# Altium footprint library OT Library.PcbLib: 396 footprints (part 5 of 25)
Each footprint in its own frame and in the unit in brackets; x right, y up, seen from the top. Pads: shape width x height; smd on the part's side, far side on the other; paste and mask are expansions set on the pad; w line width, h text height; cw(c..) or ccw(c..) is an arc to the next point about the centre after c.
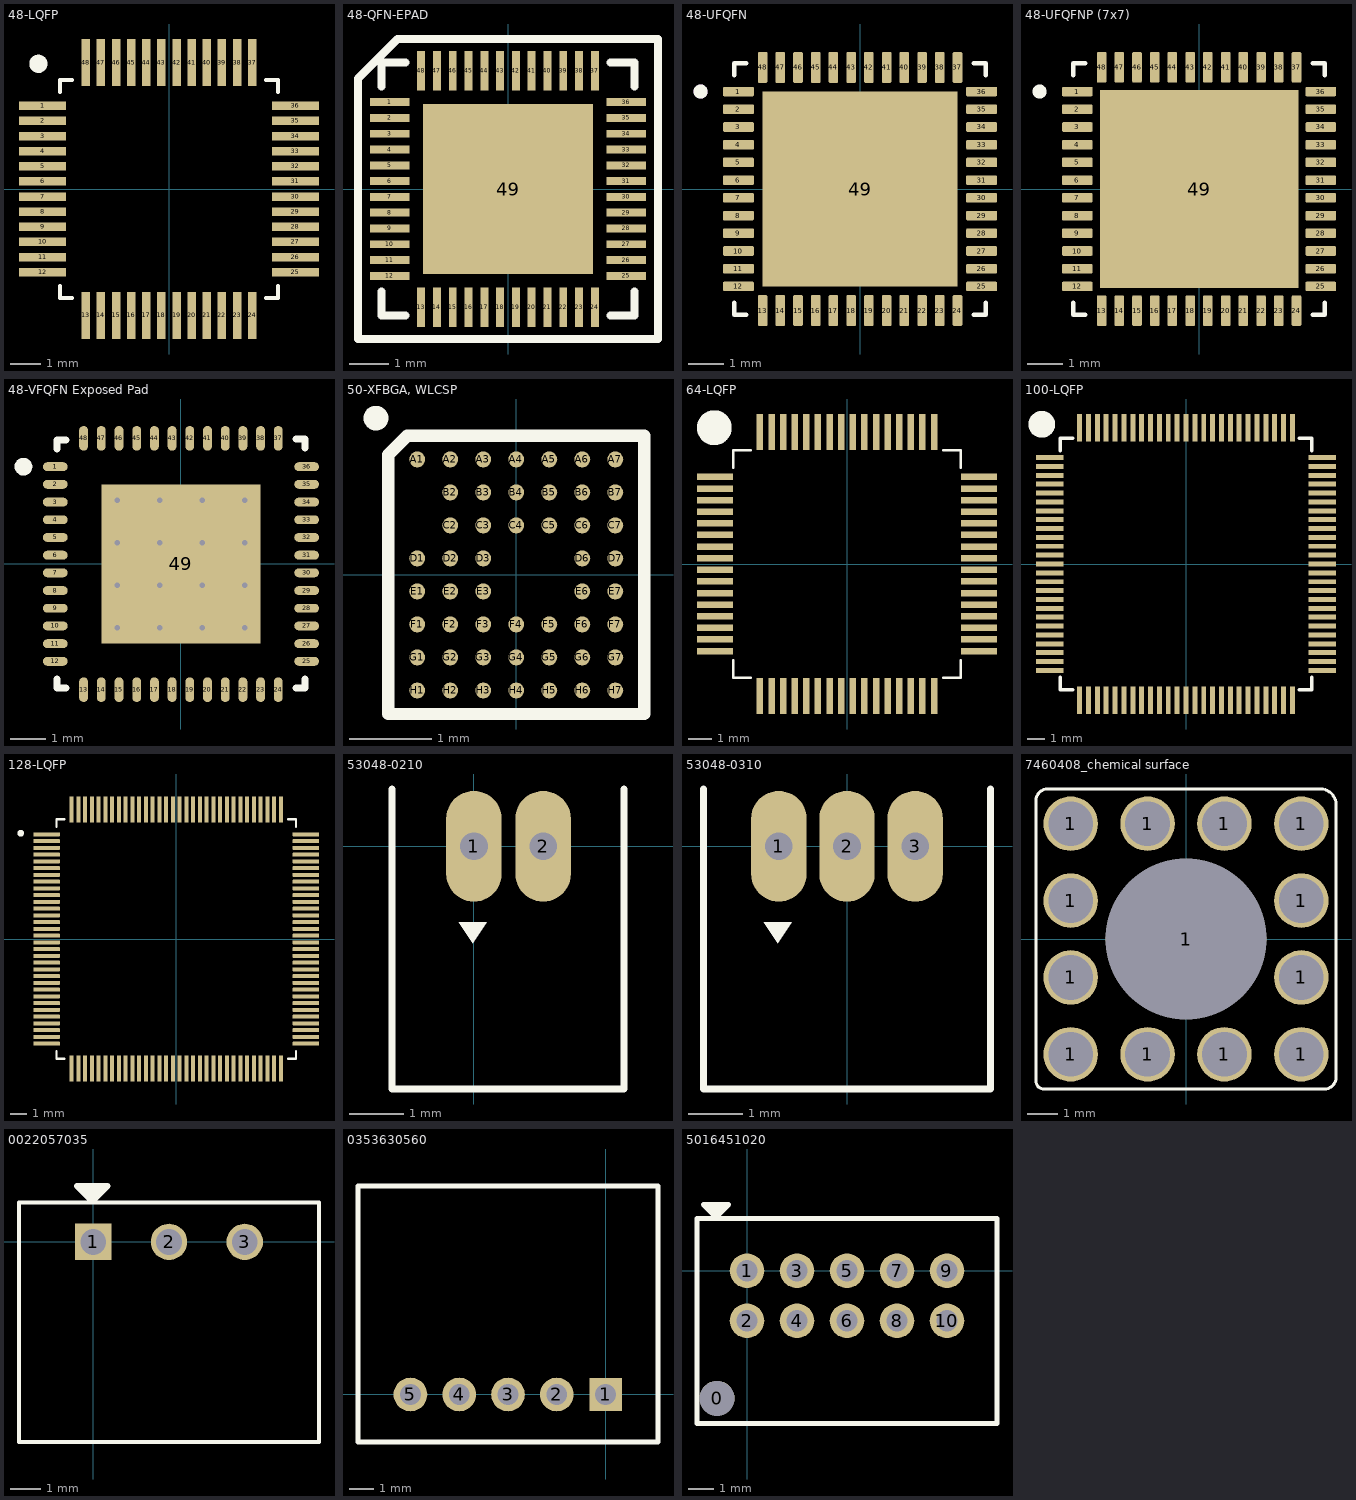
[diagram p4: the footprints below, top view; thin cyan lines are the x and y axes]

## 48-LQFP [mm] "48-LQFP (7x7)"
pads (48):
  rect 1.56x0.28 smd: 1(-4.18,2.75) 2(-4.18,2.25) 3(-4.18,1.75) 4(-4.18,1.25) 5(-4.18,0.75) 6(-4.18,0.25) 7(-4.18,-0.25) 8(-4.18,-0.75) 9(-4.18,-1.25) 10(-4.18,-1.75) 11(-4.18,-2.25) 12(-4.18,-2.75) 25(4.18,-2.75) 26(4.18,-2.25) 27(4.18,-1.75) 28(4.18,-1.25) 29(4.18,-0.75) 30(4.18,-0.25) 31(4.18,0.25) 32(4.18,0.75) 33(4.18,1.25) 34(4.18,1.75) 35(4.18,2.25) 36(4.18,2.75)
  rect 0.28x1.56 smd: 13(-2.75,-4.18) 14(-2.25,-4.18) 15(-1.75,-4.18) 16(-1.25,-4.18) 17(-0.75,-4.18) 18(-0.25,-4.18) 19(0.25,-4.18) 20(0.75,-4.18) 21(1.25,-4.18) 22(1.75,-4.18) 23(2.25,-4.18) 24(2.75,-4.18) 37(2.75,4.18) 38(2.25,4.18) 39(1.75,4.18) 40(1.25,4.18) 41(0.75,4.18) 42(0.25,4.18) 43(-0.25,4.18) 44(-0.75,4.18) 45(-1.25,4.18) 46(-1.75,4.18) 47(-2.25,4.18) 48(-2.75,4.18)
Top Overlay:
  circle w0.3: c-4.318,4.14 r0.15
  lines w0.127: -3.6,-3.21 -3.6,-3.6 -3.21,-3.6 ; -3.6,3.21 -3.6,3.6 -3.21,3.6 ; 3.21,-3.6 3.6,-3.6 3.6,-3.21 ; 3.21,3.6 3.6,3.6 3.6,3.21
3D body: height 1.6, standoff 0, extent -4.5,-4.5 4.5,4.5

## 48-QFN-EPAD [mm] "QFN 48-Leads, Body 6x6mm, Pitch 0.40mm"
height 0.9
pads (49):
  rect 1x0.2 smd: 1(-3,2.2) 2(-3,1.8) 3(-3,1.4) 4(-3,1) 5(-3,0.6) 6(-3,0.2) 7(-3,-0.2) 8(-3,-0.6) 9(-3,-1) 10(-3,-1.4) 11(-3,-1.8) 12(-3,-2.2) 25(3,-2.2) 26(3,-1.8) 27(3,-1.4) 28(3,-1) 29(3,-0.6) 30(3,-0.2) 31(3,0.2) 32(3,0.6) 33(3,1) 34(3,1.4) 35(3,1.8) 36(3,2.2)
  rect 0.2x1 smd: 13(-2.2,-3) 14(-1.8,-3) 15(-1.4,-3) 16(-1,-3) 17(-0.6,-3) 18(-0.2,-3) 19(0.2,-3) 20(0.6,-3) 21(1,-3) 22(1.4,-3) 23(1.8,-3) 24(2.2,-3) 37(2.2,3) 38(1.8,3) 39(1.4,3) 40(1,3) 41(0.6,3) 42(0.2,3) 43(-0.2,3) 44(-0.6,3) 45(-1,3) 46(-1.4,3) 47(-1.8,3) 48(-2.2,3)
  rect 4.3x4.3 smd: 49(0,0)
Top Overlay:
  lines w0.2: -3.2,-2.6 -3.2,-3.2 -2.6,-3.2 ; -3.2,2.6 -3.2,3.2 -2.6,3.2 ; 2.6,-3.2 3.2,-3.2 3.2,-2.6 ; 2.6,3.2 3.2,3.2 3.2,2.6 ; -3.8,-3.8 -3.8,2.8 -2.8,3.8 3.8,3.8 3.8,-3.8 -3.8,-3.8
3D body: height 0.9, standoff -0.01, extent -3,-3 3,3

## 48-UFQFN [mm] "48-UFQFN Exposed Pad"
pads (49):
  rrect25% 0.87x0.27 smd: 1(-3.43,2.75) 2(-3.43,2.25) 3(-3.43,1.75) 4(-3.43,1.25) 5(-3.43,0.75) 6(-3.43,0.25) 7(-3.43,-0.25) 8(-3.43,-0.75) 9(-3.43,-1.25) 10(-3.43,-1.75) 11(-3.43,-2.25) 12(-3.43,-2.75) 25(3.43,-2.75) 26(3.43,-2.25) 27(3.43,-1.75) 28(3.43,-1.25) 29(3.43,-0.75) 30(3.43,-0.25) 31(3.43,0.25) 32(3.43,0.75) 33(3.43,1.25) 34(3.43,1.75) 35(3.43,2.25) 36(3.43,2.75)
  rrect25% 0.27x0.87 smd: 13(-2.75,-3.43) 14(-2.25,-3.43) 15(-1.75,-3.43) 16(-1.25,-3.43) 17(-0.75,-3.43) 18(-0.25,-3.43) 19(0.25,-3.43) 20(0.75,-3.43) 21(1.25,-3.43) 22(1.75,-3.43) 23(2.25,-3.43) 24(2.75,-3.43) 37(2.75,3.43) 38(2.25,3.43) 39(1.75,3.43) 40(1.25,3.43) 41(0.75,3.43) 42(0.25,3.43) 43(-0.25,3.43) 44(-0.75,3.43) 45(-1.25,3.43) 46(-1.75,3.43) 47(-2.25,3.43) 48(-2.75,3.43)
  rect 5.5x5.5 smd paste-4: 49(0,0)
Top Overlay:
  circle w0.2: c-4.5,2.75 r0.1
  lines w0.127: -3.55,-3.205 -3.55,-3.55 -3.205,-3.55 ; -3.55,3.205 -3.55,3.55 -3.205,3.55 ; 3.205,-3.55 3.55,-3.55 3.55,-3.205 ; 3.205,3.55 3.55,3.55 3.55,3.205
Top Paste:
  region: 2.29,-2.29 0.51,-2.29 0.51,-0.51 2.29,-0.51
  region: -0.51,-2.29 -2.29,-2.29 -2.29,-0.51 -0.51,-0.51
  region: 2.29,0.51 0.51,0.51 0.51,2.29 2.29,2.29
  region: -0.51,0.51 -2.29,0.51 -2.29,2.29 -0.51,2.29
3D Top:
  circle w0.2: c-4.5,2.75 r0.1
3D body: height 0.6, standoff 0, extent -3.5,-3.5 3.5,3.5

## 48-UFQFNP (7x7) [mm] "48-UFQFNP Exposed Pad"
height 0.6
pads (49):
  rrect25% 0.86x0.27 smd: 1(-3.435,2.75) 2(-3.435,2.25) 3(-3.435,1.75) 4(-3.435,1.25) 5(-3.435,0.75) 6(-3.435,0.25) 7(-3.435,-0.25) 8(-3.435,-0.75) 9(-3.435,-1.25) 10(-3.435,-1.75) 11(-3.435,-2.25) 12(-3.435,-2.75) 25(3.435,-2.75) 26(3.435,-2.25) 27(3.435,-1.75) 28(3.435,-1.25) 29(3.435,-0.75) 30(3.435,-0.25) 31(3.435,0.25) 32(3.435,0.75) 33(3.435,1.25) 34(3.435,1.75) 35(3.435,2.25) 36(3.435,2.75)
  rrect25% 0.27x0.86 smd: 13(-2.75,-3.435) 14(-2.25,-3.435) 15(-1.75,-3.435) 16(-1.25,-3.435) 17(-0.75,-3.435) 18(-0.25,-3.435) 19(0.25,-3.435) 20(0.75,-3.435) 21(1.25,-3.435) 22(1.75,-3.435) 23(2.25,-3.435) 24(2.75,-3.435) 37(2.75,3.435) 38(2.25,3.435) 39(1.75,3.435) 40(1.25,3.435) 41(0.75,3.435) 42(0.25,3.435) 43(-0.25,3.435) 44(-0.75,3.435) 45(-1.25,3.435) 46(-1.75,3.435) 47(-2.25,3.435) 48(-2.75,3.435)
  rect 5.6x5.6 smd paste-2.14: 49(0,0)
Top Overlay:
  circle w0.2: c-4.5,2.75 r0.1
  lines w0.127: -3.55,-3.205 -3.55,-3.55 -3.205,-3.55 ; -3.55,3.205 -3.55,3.55 -3.205,3.55 ; 3.205,-3.55 3.55,-3.55 3.55,-3.205 ; 3.205,3.55 3.55,3.55 3.55,3.205
Top Paste:
  region: -1.21,-0.66 -2.53,-0.66 -2.53,0.66 -1.21,0.66
  region: 2.53,-0.66 1.21,-0.66 1.21,0.66 2.53,0.66
  region: -1.21,1.21 -2.53,1.21 -2.53,2.53 -1.21,2.53
  region: 0.66,1.21 -0.66,1.21 -0.66,2.53 0.66,2.53
  region: 2.53,1.21 1.21,1.21 1.21,2.53 2.53,2.53
  region: 2.53,-2.53 1.21,-2.53 1.21,-1.21 2.53,-1.21
  region: 0.66,-2.53 -0.66,-2.53 -0.66,-1.21 0.66,-1.21
  region: -1.21,-2.53 -2.53,-2.53 -2.53,-1.21 -1.21,-1.21
3D body: height 0.65, standoff 0, extent -3.5,-3.5 3.5,3.5

## 48-VFQFN Exposed Pad [mm] "48-VQFN (7x7)"
height 1
pads (49):
  oval 0.7x0.25 smd paste+0.051 mask+0.051: 1(-3.55,2.75) 2(-3.55,2.25) 3(-3.55,1.75) 4(-3.55,1.25) 5(-3.55,0.75) 6(-3.55,0.25) 7(-3.55,-0.25) 8(-3.55,-0.75) 9(-3.55,-1.25) 10(-3.55,-1.75) 11(-3.55,-2.25) 12(-3.55,-2.75) 25(3.55,-2.75) 26(3.55,-2.25) 27(3.55,-1.75) 28(3.55,-1.25) 29(3.55,-0.75) 30(3.55,-0.25) 31(3.55,0.25) 32(3.55,0.75) 33(3.55,1.25) 34(3.55,1.75) 35(3.55,2.25) 36(3.55,2.75)
  oval 0.25x0.7 smd paste+0.051 mask+0.051: 13(-2.75,-3.55) 14(-2.25,-3.55) 15(-1.75,-3.55) 16(-1.25,-3.55) 17(-0.75,-3.55) 18(-0.25,-3.55) 19(0.25,-3.55) 20(0.75,-3.55) 21(1.25,-3.55) 22(1.75,-3.55) 23(2.25,-3.55) 24(2.75,-3.55) 37(2.75,3.55) 38(2.25,3.55) 39(1.75,3.55) 40(1.25,3.55) 41(0.75,3.55) 42(0.25,3.55) 43(-0.25,3.55) 44(-0.75,3.55) 45(-1.25,3.55) 46(-1.75,3.55) 47(-2.25,3.55) 48(-2.75,3.55)
  rect 4.5x4.5 smd paste-5.08 mask+0.051: 49(0,0)
via 0.6,0.6 diameter 0.356 hole 0.152
via -0.6,0.6 diameter 0.356 hole 0.152
via 1.8,0.6 diameter 0.356 hole 0.152
via -1.8,0.6 diameter 0.356 hole 0.152
via -1.8,-0.6 diameter 0.356 hole 0.152
via 1.8,-0.6 diameter 0.356 hole 0.152
via -0.6,-0.6 diameter 0.356 hole 0.152
via 0.6,-0.6 diameter 0.356 hole 0.152
via -1.8,1.8 diameter 0.356 hole 0.152
via 1.8,1.8 diameter 0.356 hole 0.152
via -0.6,1.8 diameter 0.356 hole 0.152
via 0.6,1.8 diameter 0.356 hole 0.152
via 1.8,-1.8 diameter 0.356 hole 0.152
via -1.8,-1.8 diameter 0.356 hole 0.152
via 0.6,-1.8 diameter 0.356 hole 0.152
via -0.6,-1.8 diameter 0.356 hole 0.152
Top Overlay:
  circle w0.25: c-4.45,2.75 r0.125
  lines w0.2: -3.505,-3.251 -3.505,-3.505 -3.251,-3.505 ; -3.505,3.251 -3.505,3.505 -3.251,3.505 ; 3.251,-3.505 3.505,-3.505 3.505,-3.251 ; 3.251,3.531 3.505,3.531 3.505,3.277
Top Paste:
  rectangle: -0.45,-1.65 0.45,-0.75
  rectangle: 0.75,-1.65 1.65,-0.75
  rectangle: -1.65,-0.45 -0.75,0.45
  rectangle: -0.45,-0.45 0.45,0.45
  rectangle: 0.75,-0.45 1.65,0.45
  rectangle: 0.75,0.75 1.65,1.65
  rectangle: -0.45,0.75 0.45,1.65
  rectangle: -1.65,0.75 -0.75,1.65
  rectangle: -1.65,-1.65 -0.75,-0.75
Bottom Solder:
  rectangle: -1.65,-1.65 -0.75,-0.75
  rectangle: -1.65,0.75 -0.75,1.65
  rectangle: -0.45,0.75 0.45,1.65
  rectangle: 0.75,0.75 1.65,1.65
  rectangle: 0.75,-0.45 1.65,0.45
  rectangle: -0.45,-0.45 0.45,0.45
  rectangle: -1.65,-0.45 -0.75,0.45
  rectangle: 0.75,-1.65 1.65,-0.75
  rectangle: -0.45,-1.65 0.45,-0.75
3D body: height 0.78, standoff -0.02, extent -3.51,-3.51 3.51,3.51

## 50-XFBGA, WLCSP [mm] "50-WLCSP (2.96x3.23)"
pads (50):
  round 0.193 smd: A1(-1.2,1.4) A2(-0.8,1.4) A3(-0.4,1.4) A4(0,1.4) A5(0.4,1.4) A6(0.8,1.4) A7(1.2,1.4) B2(-0.8,1) B3(-0.4,1) B4(0,1) B5(0.4,1) B6(0.8,1) B7(1.2,1) C2(-0.8,0.6) C3(-0.4,0.6) C4(0,0.6) C5(0.4,0.6) C6(0.8,0.6) C7(1.2,0.6) D1(-1.2,0.2) D2(-0.8,0.2) D3(-0.4,0.2) D6(0.8,0.2) D7(1.2,0.2) E1(-1.2,-0.2) E2(-0.8,-0.2) E3(-0.4,-0.2) E6(0.8,-0.2) E7(1.2,-0.2) F1(-1.2,-0.6) F2(-0.8,-0.6) F3(-0.4,-0.6) F4(0,-0.6) F5(0.4,-0.6) F6(0.8,-0.6) F7(1.2,-0.6) G1(-1.2,-1) G2(-0.8,-1) G3(-0.4,-1) G4(0,-1) G5(0.4,-1) G6(0.8,-1) G7(1.2,-1) H1(-1.2,-1.4) H2(-0.8,-1.4) H3(-0.4,-1.4) H4(0,-1.4) H5(0.4,-1.4) H6(0.8,-1.4) H7(1.2,-1.4)
Top Overlay:
  circle w0.2: c-1.7,1.9 r0.05
  lines w0.15: -1.55,-1.685 1.55,-1.685 1.55,1.685 -1.323,1.685 -1.55,1.458 -1.55,-1.685
3D body: height 0.5, standoff 0, extent -1.475,-1.61 1.475,1.61

## 64-LQFP [mm] "64-LQFP (10x10)"
pads (64):
  rect 1.559x0.28 smd: 1(-5.678,3.75) 2(-5.678,3.25) 3(-5.678,2.75) 4(-5.678,2.25) 5(-5.678,1.75) 6(-5.678,1.25) 7(-5.678,0.75) 8(-5.678,0.25) 9(-5.678,-0.25) 10(-5.678,-0.75) 11(-5.678,-1.25) 12(-5.678,-1.75) 13(-5.678,-2.25) 14(-5.678,-2.75) 15(-5.678,-3.25) 16(-5.678,-3.75) 33(5.678,-3.75) 34(5.678,-3.25) 35(5.678,-2.75) 36(5.678,-2.25) 37(5.678,-1.75) 38(5.678,-1.25) 39(5.678,-0.75) 40(5.678,-0.25) 41(5.678,0.25) 42(5.678,0.75) 43(5.678,1.25) 44(5.678,1.75) 45(5.678,2.25) 46(5.678,2.75) 47(5.678,3.25) 48(5.678,3.75)
  rect 0.28x1.559 smd: 17(-3.75,-5.678) 18(-3.25,-5.678) 19(-2.75,-5.678) 20(-2.25,-5.678) 21(-1.75,-5.678) 22(-1.25,-5.678) 23(-0.75,-5.678) 24(-0.25,-5.678) 25(0.25,-5.678) 26(0.75,-5.678) 27(1.25,-5.678) 28(1.75,-5.678) 29(2.25,-5.678) 30(2.75,-5.678) 31(3.25,-5.678) 32(3.75,-5.678) 49(3.75,5.678) 50(3.25,5.678) 51(2.75,5.678) 52(2.25,5.678) 53(1.75,5.678) 54(1.25,5.678) 55(0.75,5.678) 56(0.25,5.678) 57(-0.25,5.678) 58(-0.75,5.678) 59(-1.25,5.678) 60(-1.75,5.678) 61(-2.25,5.678) 62(-2.75,5.678) 63(-3.25,5.678) 64(-3.75,5.678)
Top Overlay:
  circle w1: c-5.715,5.867 r0.25
  lines w0.12: -4.9,-4.144 -4.9,-4.9 -4.144,-4.9 ; -4.9,4.144 -4.9,4.9 -4.144,4.9 ; 4.144,-4.9 4.9,-4.9 4.9,-4.144 ; 4.144,4.9 4.9,4.9 4.9,4.144
3D body: height 1.6, standoff 0, extent -6,-6 6,6

## 100-LQFP [mm] "100-LQFP (14x14)"
pads (100):
  rect 1.559x0.28 smd: 1(-7.678,6) 2(-7.678,5.5) 3(-7.678,5) 4(-7.678,4.5) 5(-7.678,4) 6(-7.678,3.5) 7(-7.678,3) 8(-7.678,2.5) 9(-7.678,2) 10(-7.678,1.5) 11(-7.678,1) 12(-7.678,0.5) 13(-7.678,0) 14(-7.678,-0.5) 15(-7.678,-1) 16(-7.678,-1.5) 17(-7.678,-2) 18(-7.678,-2.5) 19(-7.678,-3) 20(-7.678,-3.5) 21(-7.678,-4) 22(-7.678,-4.5) 23(-7.678,-5) 24(-7.678,-5.5) 25(-7.678,-6) 51(7.678,-6) 52(7.678,-5.5) 53(7.678,-5) 54(7.678,-4.5) 55(7.678,-4) 56(7.678,-3.5) 57(7.678,-3) 58(7.678,-2.5) 59(7.678,-2) 60(7.678,-1.5) 61(7.678,-1) 62(7.678,-0.5) 63(7.678,0) 64(7.678,0.5) 65(7.678,1) 66(7.678,1.5) 67(7.678,2) 68(7.678,2.5) 69(7.678,3) 70(7.678,3.5) 71(7.678,4) 72(7.678,4.5) 73(7.678,5) 74(7.678,5.5) 75(7.678,6)
  rect 0.28x1.559 smd: 26(-6,-7.678) 27(-5.5,-7.678) 28(-5,-7.678) 29(-4.5,-7.678) 30(-4,-7.678) 31(-3.5,-7.678) 32(-3,-7.678) 33(-2.5,-7.678) 34(-2,-7.678) 35(-1.5,-7.678) 36(-1,-7.678) 37(-0.5,-7.678) 38(0,-7.678) 39(0.5,-7.678) 40(1,-7.678) 41(1.5,-7.678) 42(2,-7.678) 43(2.5,-7.678) 44(3,-7.678) 45(3.5,-7.678) 46(4,-7.678) 47(4.5,-7.678) 48(5,-7.678) 49(5.5,-7.678) 50(6,-7.678) 76(6,7.678) 77(5.5,7.678) 78(5,7.678) 79(4.5,7.678) 80(4,7.678) 81(3.5,7.678) 82(3,7.678) 83(2.5,7.678) 84(2,7.678) 85(1.5,7.678) 86(1,7.678) 87(0.5,7.678) 88(0,7.678) 89(-0.5,7.678) 90(-1,7.678) 91(-1.5,7.678) 92(-2,7.678) 93(-2.5,7.678) 94(-3,7.678) 95(-3.5,7.678) 96(-4,7.678) 97(-4.5,7.678) 98(-5,7.678) 99(-5.5,7.678) 100(-6,7.678)
Top Overlay:
  circle w1: c-8.128,7.874 r0.254
  lines w0.203: -7.1,-6.394 -7.1,-7.1 -6.394,-7.1 ; -7.1,6.394 -7.1,7.1 -6.394,7.1 ; 6.394,-7.1 7.1,-7.1 7.1,-6.394 ; 6.394,7.1 7.1,7.1 7.1,6.394
3D body: height 1.53, standoff -0.07, extent -8,-8 8,8

## 128-LQFP [mm] "128-LQFP (14x14)"
pads (128):
  rrect25% 1.56x0.24 smd: 1(-7.68,6.2) 2(-7.68,5.8) 3(-7.68,5.4) 4(-7.68,5) 5(-7.68,4.6) 6(-7.68,4.2) 7(-7.68,3.8) 8(-7.68,3.4) 9(-7.68,3) 10(-7.68,2.6) 11(-7.68,2.2) 12(-7.68,1.8) 13(-7.68,1.4) 14(-7.68,1) 15(-7.68,0.6) 16(-7.68,0.2) 17(-7.68,-0.2) 18(-7.68,-0.6) 19(-7.68,-1) 20(-7.68,-1.4) 21(-7.68,-1.8) 22(-7.68,-2.2) 23(-7.68,-2.6) 24(-7.68,-3) 25(-7.68,-3.4) 26(-7.68,-3.8) 27(-7.68,-4.2) 28(-7.68,-4.6) 29(-7.68,-5) 30(-7.68,-5.4) 31(-7.68,-5.8) 32(-7.68,-6.2) 65(7.68,-6.2) 66(7.68,-5.8) 67(7.68,-5.4) 68(7.68,-5) 69(7.68,-4.6) 70(7.68,-4.2) 71(7.68,-3.8) 72(7.68,-3.4) 73(7.68,-3) 74(7.68,-2.6) 75(7.68,-2.2) 76(7.68,-1.8) 77(7.68,-1.4) 78(7.68,-1) 79(7.68,-0.6) 80(7.68,-0.2) 81(7.68,0.2) 82(7.68,0.6) 83(7.68,1) 84(7.68,1.4) 85(7.68,1.8) 86(7.68,2.2) 87(7.68,2.6) 88(7.68,3) 89(7.68,3.4) 90(7.68,3.8) 91(7.68,4.2) 92(7.68,4.6) 93(7.68,5) 94(7.68,5.4) 95(7.68,5.8) 96(7.68,6.2)
  rrect25% 0.24x1.56 smd: 33(-6.2,-7.68) 34(-5.8,-7.68) 35(-5.4,-7.68) 36(-5,-7.68) 37(-4.6,-7.68) 38(-4.2,-7.68) 39(-3.8,-7.68) 40(-3.4,-7.68) 41(-3,-7.68) 42(-2.6,-7.68) 43(-2.2,-7.68) 44(-1.8,-7.68) 45(-1.4,-7.68) 46(-1,-7.68) 47(-0.6,-7.68) 48(-0.2,-7.68) 49(0.2,-7.68) 50(0.6,-7.68) 51(1,-7.68) 52(1.4,-7.68) 53(1.8,-7.68) 54(2.2,-7.68) 55(2.6,-7.68) 56(3,-7.68) 57(3.4,-7.68) 58(3.8,-7.68) 59(4.2,-7.68) 60(4.6,-7.68) 61(5,-7.68) 62(5.4,-7.68) 63(5.8,-7.68) 64(6.2,-7.68) 97(6.2,7.68) 98(5.8,7.68) 99(5.4,7.68) 100(5,7.68) 101(4.6,7.68) 102(4.2,7.68) 103(3.8,7.68) 104(3.4,7.68) 105(3,7.68) 106(2.6,7.68) 107(2.2,7.68) 108(1.8,7.68) 109(1.4,7.68) 110(1,7.68) 111(0.6,7.68) 112(0.2,7.68) 113(-0.2,7.68) 114(-0.6,7.68) 115(-1,7.68) 116(-1.4,7.68) 117(-1.8,7.68) 118(-2.2,7.68) 119(-2.6,7.68) 120(-3,7.68) 121(-3.4,7.68) 122(-3.8,7.68) 123(-4.2,7.68) 124(-4.6,7.68) 125(-5,7.68) 126(-5.4,7.68) 127(-5.8,7.68) 128(-6.2,7.68)
Top Overlay:
  circle w0.2: c-9.22,6.274 r0.1
  lines w0.127: -7.1,-6.64 -7.1,-7.1 -6.64,-7.1 ; -7.1,6.64 -7.1,7.1 -6.64,7.1 ; 6.64,-7.1 7.1,-7.1 7.1,-6.64 ; 6.64,7.1 7.1,7.1 7.1,6.64
3D body: height 1.6, standoff 0, extent -8,-8 8,8

## 142.5631.6102 [mm] "FUSE"
3D body: height 13.9, standoff 6.1, extent -21,-6 21,6

## 53048-0210 [mil]
height 137.8
pads (2):
  oval 40x80 hole 20: 1(0,0) 2(50,0)
Top Overlay:
  region: -0.79,-70 -10.79,-55 9.21,-55
  region: -0.79,-70 -10.79,-55 9.21,-55
  lines w5: -59.06,41.34 -59.06,-175.2 108.27,-175.2 108.27,41.34
3D body: height 131.89, standoff -96.46, extent -60,-178.27 107.32,38.27

## 53048-0310 [mil]
pads (3):
  oval 40x80 hole 20: 1(-49.21,0) 2(0,0) 3(49.21,0)
Top Overlay:
  region: -50,-70 -60,-55 -40,-55
  lines w5: -103.54,41.34 -103.54,-175.2 103.54,-175.2 103.54,41.34
3D body: height 131.89, standoff -96.46, extent -108.27,-175.2 108.27,41.34

## 7460408_chemical surface [mm] "M5, thr 6mm"
height 6
pads (13):
  round 1.8 hole 1.475: 1(-3.81,-3.81) 1(-3.81,-1.27) 1(-3.81,1.27) 1(-3.81,3.81) 1(-1.27,-3.81) 1(-1.27,3.81) 1(1.27,-3.81) 1(1.27,3.81) 1(3.81,-3.81) 1(3.81,-1.27) 1(3.81,1.27) 1(3.81,3.81)
  round 5.3 hole 5.3: 1(0,0)
Top Overlay:
  lines w0.1: -4.953,-4.699 ccw(c-4.699,-4.699) -4.699,-4.953 4.572,-4.953 ccw(c4.572,-4.572) 4.953,-4.572 4.953,4.445 ccw(c4.445,4.445) 4.445,4.953 -4.572,4.953 ccw(c-4.572,4.572) -4.953,4.572 -4.953,-4.699
3D body: height 6, standoff -3.5, extent -4.5,-4.5 4.5,4.5

## 0022057035 [mm]
height 4.9
pads (3):
  rect 1.2x1.2 / inner round 1.2 / far side rect 1.2x1.2 hole 0.85 mask+0.076: 1(0,0)
  round 1.2 hole 0.85 mask+0.076: 2(2.5,0) 3(5,0)
Top Overlay:
  region: 0.463,1.842 0.006,1.384 -0.079,1.384 -0.486,1.791 -0.435,1.842
  lines w0.127: -2.45,-6.6 7.45,-6.6 7.45,1.3 -2.45,1.3 -2.45,-6.6
  lines w0.2: -0.537,1.842 -0.037,1.342 0.463,1.842 -0.537,1.842
3D body: height 4.9, standoff -3.5, extent -2.45,-6.55 7.45,1.35

## 0353630560 [mm]
height 5.51
pads (5):
  rect 1.337x1.337 / inner rect 1.524x1.524 / far side rect 1.337x1.337 hole 0.85: 1(0,0)
  round 1.381 / inner round 1.524 / far side round 1.381 hole 0.85: 2(-2,0) 3(-4,0) 4(-6,0) 5(-8,0)
Top Overlay:
  lines w0.2: -10.15,-1.95 2.15,-1.95 2.15,8.55 -10.15,8.55 -10.15,-1.95
3D body: height 1.65, standoff -7.05, extent -10.163,-1.907 2.137,8.593

## 5016451020 [mm]
pads (11):
  round 1.4 hole 1.4 unplated: 0(-1.2,-5.1)
  round 1.381 / inner round 1.524 / far side round 1.381 hole 0.85: 1(0,0) 2(0,-2) 3(2,0) 4(2,-2) 5(4,0) 6(4,-2) 7(6,0) 8(6,-2) 9(8,0) 10(8,-2)
Top Overlay:
  region: -0.737,2.642 -1.194,2.184 -1.279,2.184 -1.686,2.591 -1.635,2.642
  lines w0.2: -2,-6.1 -2,2.1 10,2.1 10,-6.1 -2,-6.1 ; -1.737,2.642 -0.737,2.642 -1.237,2.142 -1.737,2.642
3D body: height 4.43, standoff -10.78, extent -1.981,-6.092 10.019,2.108